# Altium schematic symbol library jlcpcb_2025_04_resistors_extended_0201.schlib: 1508 symbols (part 7 of 8) (continued)
## RTT014750FTH
designator R?  Resistance: 475Ω  (hidden comment: *)
Resistor, 475Ω, ±1%, 50mW, ±200ppm/℃, SMD 0201; Manufacturer: Uniroyal; Manufacturer Part Number: RTT014750FTH; Supplier 1: LCSC; Supplier Part Number 1: C166180; JLCPCB Part Number: C166180; Power Rating: 50mW; Category: Resistors; Package Size: 0201; JLCPCB Basic Part: Yes; Tolerance: ±1%; Temperature Coefficient: ±200ppm/℃; ComponentLink1Description: Datasheet; ComponentLink1URL: https://wmsc.lcsc.com/wmsc/upload/file/pdf/v2/lcsc/2304140030_RALEC-RTT014750FTH_C166180.pdf; ComponentLink2Description: JLCPCB Part URL; ComponentLink2URL: https://jlcpcb.com/partdetail/C166180
pins: 1, 2
1 alternate drawing of the same symbol

## RTT014752FTH
designator R?  Resistance: 47.5kΩ  (hidden comment: *)
Resistor, 47.5kΩ, ±1%, 50mW, ±200ppm/℃, SMD 0201; Manufacturer: Uniroyal; Manufacturer Part Number: RTT014752FTH; Supplier 1: LCSC; Supplier Part Number 1: C166179; JLCPCB Part Number: C166179; Power Rating: 50mW; Category: Resistors; Package Size: 0201; JLCPCB Basic Part: Yes; Tolerance: ±1%; Temperature Coefficient: ±200ppm/℃; ComponentLink1Description: Datasheet; ComponentLink1URL: https://wmsc.lcsc.com/wmsc/upload/file/pdf/v2/lcsc/2304140030_RALEC-RTT014752FTH_C166179.pdf; ComponentLink2Description: JLCPCB Part URL; ComponentLink2URL: https://jlcpcb.com/partdetail/C166179
pins: 1, 2
1 alternate drawing of the same symbol

## RTT014990FTH
designator R?  Resistance: 499Ω  (hidden comment: *)
Resistor, 499Ω, ±1%, 50mW, 25V, ±200ppm/℃, -55℃~+125℃, SMD 0201; Manufacturer: Uniroyal; Manufacturer Part Number: RTT014990FTH; Supplier 1: LCSC; Supplier Part Number 1: C166172; JLCPCB Part Number: C166172; Power Rating: 50mW; Category: Resistors; Package Size: 0201; JLCPCB Basic Part: Yes; Tolerance: ±1%; Voltage Rating: 25V; Temperature Coefficient: ±200ppm/℃; Temperature Rating: -55℃~+125℃; ComponentLink1Description: Datasheet; ComponentLink1URL: https://wmsc.lcsc.com/wmsc/upload/file/pdf/v2/lcsc/2304140030_RALEC-RTT014990FTH_C166172.pdf; ComponentLink2Description: JLCPCB Part URL; ComponentLink2URL: https://jlcpcb.com/partdetail/C166172
pins: 1, 2
1 alternate drawing of the same symbol

## RTT014993FTH
designator R?  Resistance: 499kΩ  (hidden comment: *)
Resistor, 499kΩ, ±1%, 50mW, 25V, ±200ppm/℃, -55℃~+125℃, SMD 0201; Manufacturer: Uniroyal; Manufacturer Part Number: RTT014993FTH; Supplier 1: LCSC; Supplier Part Number 1: C166171; JLCPCB Part Number: C166171; Power Rating: 50mW; Category: Resistors; Package Size: 0201; JLCPCB Basic Part: Yes; Tolerance: ±1%; Voltage Rating: 25V; Temperature Coefficient: ±200ppm/℃; Temperature Rating: -55℃~+125℃; ComponentLink1Description: Datasheet; ComponentLink1URL: https://wmsc.lcsc.com/wmsc/upload/file/pdf/v2/lcsc/2304140030_RALEC-RTT014993FTH_C166171.pdf; ComponentLink2Description: JLCPCB Part URL; ComponentLink2URL: https://jlcpcb.com/partdetail/C166171
pins: 1, 2
1 alternate drawing of the same symbol

## RTT014994FTH
designator R?  Resistance: 4.99MΩ  (hidden comment: *)
Resistor, 4.99MΩ, ±1%, 50mW, 25V, ±200ppm/℃, -55℃~+125℃, SMD 0201; Manufacturer: Uniroyal; Manufacturer Part Number: RTT014994FTH; Supplier 1: LCSC; Supplier Part Number 1: C166170; JLCPCB Part Number: C166170; Power Rating: 50mW; Category: Resistors; Package Size: 0201; JLCPCB Basic Part: Yes; Tolerance: ±1%; Voltage Rating: 25V; Temperature Coefficient: ±200ppm/℃; Temperature Rating: -55℃~+125℃; ComponentLink1Description: Datasheet; ComponentLink1URL: https://wmsc.lcsc.com/wmsc/upload/file/pdf/v2/lcsc/2304140030_RALEC-RTT014994FTH_C166170.pdf; ComponentLink2Description: JLCPCB Part URL; ComponentLink2URL: https://jlcpcb.com/partdetail/C166170
pins: 1, 2
1 alternate drawing of the same symbol

## RTT015111FTH
designator R?  Resistance: 5.11kΩ  (hidden comment: *)
Resistor, 5.11kΩ, ±1%, 50mW, ±200ppm/℃, SMD 0201; Manufacturer: Uniroyal; Manufacturer Part Number: RTT015111FTH; Supplier 1: LCSC; Supplier Part Number 1: C166168; JLCPCB Part Number: C166168; Power Rating: 50mW; Category: Resistors; Package Size: 0201; JLCPCB Basic Part: Yes; Tolerance: ±1%; Temperature Coefficient: ±200ppm/℃; ComponentLink1Description: Datasheet; ComponentLink1URL: https://wmsc.lcsc.com/wmsc/upload/file/pdf/v2/lcsc/2304140030_RALEC-RTT015111FTH_C166168.pdf; ComponentLink2Description: JLCPCB Part URL; ComponentLink2URL: https://jlcpcb.com/partdetail/C166168
pins: 1, 2
1 alternate drawing of the same symbol

## RTT015112FTH
designator R?  Resistance: 51.1kΩ  (hidden comment: *)
Resistor, 51.1kΩ, ±1%, 50mW, 25V, ±200ppm/℃, -55℃~+125℃, SMD 0201; Manufacturer: Uniroyal; Manufacturer Part Number: RTT015112FTH; Supplier 1: LCSC; Supplier Part Number 1: C166167; JLCPCB Part Number: C166167; Power Rating: 50mW; Category: Resistors; Package Size: 0201; JLCPCB Basic Part: Yes; Tolerance: ±1%; Voltage Rating: 25V; Temperature Coefficient: ±200ppm/℃; Temperature Rating: -55℃~+125℃; ComponentLink1Description: Datasheet; ComponentLink1URL: https://wmsc.lcsc.com/wmsc/upload/file/pdf/v2/lcsc/2304140030_RALEC-RTT015112FTH_C166167.pdf; ComponentLink2Description: JLCPCB Part URL; ComponentLink2URL: https://jlcpcb.com/partdetail/C166167
pins: 1, 2
1 alternate drawing of the same symbol

## RTT015113FTH
designator R?  Resistance: 511kΩ  (hidden comment: *)
Resistor, 511kΩ, ±1%, 50mW, 25V, ±200ppm/℃, -55℃~+125℃, SMD 0201; Manufacturer: Uniroyal; Manufacturer Part Number: RTT015113FTH; Supplier 1: LCSC; Supplier Part Number 1: C166166; JLCPCB Part Number: C166166; Power Rating: 50mW; Category: Resistors; Package Size: 0201; JLCPCB Basic Part: Yes; Tolerance: ±1%; Voltage Rating: 25V; Temperature Coefficient: ±200ppm/℃; Temperature Rating: -55℃~+125℃; ComponentLink1Description: Datasheet; ComponentLink1URL: https://wmsc.lcsc.com/wmsc/upload/file/pdf/v2/lcsc/2304140030_RALEC-RTT015113FTH_C166166.pdf; ComponentLink2Description: JLCPCB Part URL; ComponentLink2URL: https://jlcpcb.com/partdetail/C166166
pins: 1, 2
1 alternate drawing of the same symbol

## RTT015230FTH
designator R?  Resistance: 523Ω  (hidden comment: *)
Resistor, 523Ω, ±1%, 50mW, ±200ppm/℃, SMD 0201; Manufacturer: Uniroyal; Manufacturer Part Number: RTT015230FTH; Supplier 1: LCSC; Supplier Part Number 1: C158463; JLCPCB Part Number: C158463; Power Rating: 50mW; Category: Resistors; Package Size: 0201; JLCPCB Basic Part: Yes; Tolerance: ±1%; Temperature Coefficient: ±200ppm/℃; ComponentLink1Description: Datasheet; ComponentLink1URL: https://wmsc.lcsc.com/wmsc/upload/file/pdf/v2/lcsc/2304140030_RALEC-RTT015230FTH_C158463.pdf; ComponentLink2Description: JLCPCB Part URL; ComponentLink2URL: https://jlcpcb.com/partdetail/C158463
pins: 1, 2
1 alternate drawing of the same symbol

## RTT015360FTH
designator R?  Resistance: 536Ω  (hidden comment: *)
Resistor, 536Ω, ±1%, 50mW, 25V, ±200ppm/℃, -55℃~+125℃, SMD 0201; Manufacturer: Uniroyal; Manufacturer Part Number: RTT015360FTH; Supplier 1: LCSC; Supplier Part Number 1: C166162; JLCPCB Part Number: C166162; Power Rating: 50mW; Category: Resistors; Package Size: 0201; JLCPCB Basic Part: Yes; Tolerance: ±1%; Voltage Rating: 25V; Temperature Coefficient: ±200ppm/℃; Temperature Rating: -55℃~+125℃; ComponentLink1Description: Datasheet; ComponentLink1URL: https://wmsc.lcsc.com/wmsc/upload/file/pdf/v2/lcsc/2304140030_RALEC-RTT015360FTH_C166162.pdf; ComponentLink2Description: JLCPCB Part URL; ComponentLink2URL: https://jlcpcb.com/partdetail/C166162
pins: 1, 2
1 alternate drawing of the same symbol

## RTT015362FTH
designator R?  Resistance: 53.6kΩ  (hidden comment: *)
Resistor, 53.6kΩ, ±1%, 50mW, 25V, ±200ppm/℃, -55℃~+125℃, SMD 0201; Manufacturer: Uniroyal; Manufacturer Part Number: RTT015362FTH; Supplier 1: LCSC; Supplier Part Number 1: C166160; JLCPCB Part Number: C166160; Power Rating: 50mW; Category: Resistors; Package Size: 0201; JLCPCB Basic Part: Yes; Tolerance: ±1%; Voltage Rating: 25V; Temperature Coefficient: ±200ppm/℃; Temperature Rating: -55℃~+125℃; ComponentLink1Description: Datasheet; ComponentLink1URL: https://wmsc.lcsc.com/wmsc/upload/file/pdf/v2/lcsc/2304140030_RALEC-RTT015362FTH_C166160.pdf; ComponentLink2Description: JLCPCB Part URL; ComponentLink2URL: https://jlcpcb.com/partdetail/C166160
pins: 1, 2
1 alternate drawing of the same symbol

## RTT015490FTH
designator R?  Resistance: 549Ω  (hidden comment: *)
Resistor, 549Ω, ±1%, 50mW, 25V, ±200ppm/℃, -55℃~+125℃, SMD 0201; Manufacturer: Uniroyal; Manufacturer Part Number: RTT015490FTH; Supplier 1: LCSC; Supplier Part Number 1: C166159; JLCPCB Part Number: C166159; Power Rating: 50mW; Category: Resistors; Package Size: 0201; JLCPCB Basic Part: Yes; Tolerance: ±1%; Voltage Rating: 25V; Temperature Coefficient: ±200ppm/℃; Temperature Rating: -55℃~+125℃; ComponentLink1Description: Datasheet; ComponentLink1URL: https://wmsc.lcsc.com/wmsc/upload/file/pdf/v2/lcsc/2304140030_RALEC-RTT015490FTH_C166159.pdf; ComponentLink2Description: JLCPCB Part URL; ComponentLink2URL: https://jlcpcb.com/partdetail/C166159
pins: 1, 2
1 alternate drawing of the same symbol

## RTT015491FTH
designator R?  Resistance: 5.49kΩ  (hidden comment: *)
Resistor, 5.49kΩ, ±1%, 50mW, ±200ppm/℃, SMD 0201; Manufacturer: Uniroyal; Manufacturer Part Number: RTT015491FTH; Supplier 1: LCSC; Supplier Part Number 1: C166158; JLCPCB Part Number: C166158; Power Rating: 50mW; Category: Resistors; Package Size: 0201; JLCPCB Basic Part: Yes; Tolerance: ±1%; Temperature Coefficient: ±200ppm/℃; ComponentLink1Description: Datasheet; ComponentLink1URL: https://wmsc.lcsc.com/wmsc/upload/file/pdf/v2/lcsc/2304140030_RALEC-RTT015491FTH_C166158.pdf; ComponentLink2Description: JLCPCB Part URL; ComponentLink2URL: https://jlcpcb.com/partdetail/C166158
pins: 1, 2
1 alternate drawing of the same symbol

## RTT015492FTH
designator R?  Resistance: 54.9kΩ  (hidden comment: *)
Resistor, 54.9kΩ, ±1%, 50mW, 25V, ±200ppm/℃, -55℃~+125℃, SMD 0201; Manufacturer: Uniroyal; Manufacturer Part Number: RTT015492FTH; Supplier 1: LCSC; Supplier Part Number 1: C166157; JLCPCB Part Number: C166157; Power Rating: 50mW; Category: Resistors; Package Size: 0201; JLCPCB Basic Part: Yes; Tolerance: ±1%; Voltage Rating: 25V; Temperature Coefficient: ±200ppm/℃; Temperature Rating: -55℃~+125℃; ComponentLink1Description: Datasheet; ComponentLink1URL: https://wmsc.lcsc.com/wmsc/upload/file/pdf/v2/lcsc/2304140030_RALEC-RTT015492FTH_C166157.pdf; ComponentLink2Description: JLCPCB Part URL; ComponentLink2URL: https://jlcpcb.com/partdetail/C166157
pins: 1, 2
1 alternate drawing of the same symbol

## RTT015600FTH
designator R?  Resistance: 560Ω  (hidden comment: *)
Resistor, 560Ω, ±1%, 50mW, 25V, ±200ppm/℃, -55℃~+125℃, SMD 0201; Manufacturer: Uniroyal; Manufacturer Part Number: RTT015600FTH; Supplier 1: LCSC; Supplier Part Number 1: C158457; JLCPCB Part Number: C158457; Power Rating: 50mW; Category: Resistors; Package Size: 0201; JLCPCB Basic Part: Yes; Tolerance: ±1%; Voltage Rating: 25V; Temperature Coefficient: ±200ppm/℃; Temperature Rating: -55℃~+125℃; ComponentLink1Description: Datasheet; ComponentLink1URL: https://wmsc.lcsc.com/wmsc/upload/file/pdf/v2/lcsc/2304140030_RALEC-RTT015600FTH_C158457.pdf; ComponentLink2Description: JLCPCB Part URL; ComponentLink2URL: https://jlcpcb.com/partdetail/C158457
pins: 1, 2
1 alternate drawing of the same symbol

## RTT015602FTH
designator R?  Resistance: 56kΩ  (hidden comment: *)
Resistor, 56kΩ, ±1%, 50mW, 25V, ±200ppm/℃, -55℃~+125℃, SMD 0201; Manufacturer: Uniroyal; Manufacturer Part Number: RTT015602FTH; Supplier 1: LCSC; Supplier Part Number 1: C158452; JLCPCB Part Number: C158452; Power Rating: 50mW; Category: Resistors; Package Size: 0201; JLCPCB Basic Part: Yes; Tolerance: ±1%; Voltage Rating: 25V; Temperature Coefficient: ±200ppm/℃; Temperature Rating: -55℃~+125℃; ComponentLink1Description: Datasheet; ComponentLink1URL: https://wmsc.lcsc.com/wmsc/upload/file/pdf/v2/lcsc/2304140030_RALEC-RTT015602FTH_C158452.pdf; ComponentLink2Description: JLCPCB Part URL; ComponentLink2URL: https://jlcpcb.com/partdetail/C158452
pins: 1, 2
1 alternate drawing of the same symbol

## RTT015603FTH
designator R?  Resistance: 560kΩ  (hidden comment: *)
Resistor, 560kΩ, ±1%, 50mW, 25V, ±200ppm/℃, -55℃~+125℃, SMD 0201; Manufacturer: Uniroyal; Manufacturer Part Number: RTT015603FTH; Supplier 1: LCSC; Supplier Part Number 1: C158450; JLCPCB Part Number: C158450; Power Rating: 50mW; Category: Resistors; Package Size: 0201; JLCPCB Basic Part: Yes; Tolerance: ±1%; Voltage Rating: 25V; Temperature Coefficient: ±200ppm/℃; Temperature Rating: -55℃~+125℃; ComponentLink1Description: Datasheet; ComponentLink1URL: https://wmsc.lcsc.com/wmsc/upload/file/pdf/v2/lcsc/2304140030_RALEC-RTT015603FTH_C158450.pdf; ComponentLink2Description: JLCPCB Part URL; ComponentLink2URL: https://jlcpcb.com/partdetail/C158450
pins: 1, 2
1 alternate drawing of the same symbol

## RTT015621FTH
designator R?  Resistance: 5.62kΩ  (hidden comment: *)
Resistor, 5.62kΩ, ±1%, 50mW, ±200ppm/℃, SMD 0201; Manufacturer: Uniroyal; Manufacturer Part Number: RTT015621FTH; Supplier 1: LCSC; Supplier Part Number 1: C166152; JLCPCB Part Number: C166152; Power Rating: 50mW; Category: Resistors; Package Size: 0201; JLCPCB Basic Part: Yes; Tolerance: ±1%; Temperature Coefficient: ±200ppm/℃; ComponentLink1Description: Datasheet; ComponentLink1URL: https://wmsc.lcsc.com/wmsc/upload/file/pdf/v2/lcsc/2304140030_RALEC-RTT015621FTH_C166152.pdf; ComponentLink2Description: JLCPCB Part URL; ComponentLink2URL: https://jlcpcb.com/partdetail/C166152
pins: 1, 2
1 alternate drawing of the same symbol

## RTT015622FTH
designator R?  Resistance: 56.2kΩ  (hidden comment: *)
Resistor, 56.2kΩ, ±1%, 50mW, 25V, ±200ppm/℃, -55℃~+125℃, SMD 0201; Manufacturer: Uniroyal; Manufacturer Part Number: RTT015622FTH; Supplier 1: LCSC; Supplier Part Number 1: C166151; JLCPCB Part Number: C166151; Power Rating: 50mW; Category: Resistors; Package Size: 0201; JLCPCB Basic Part: Yes; Tolerance: ±1%; Voltage Rating: 25V; Temperature Coefficient: ±200ppm/℃; Temperature Rating: -55℃~+125℃; ComponentLink1Description: Datasheet; ComponentLink1URL: https://wmsc.lcsc.com/wmsc/upload/file/pdf/v2/lcsc/2304140030_RALEC-RTT015622FTH_C166151.pdf; ComponentLink2Description: JLCPCB Part URL; ComponentLink2URL: https://jlcpcb.com/partdetail/C166151
pins: 1, 2
1 alternate drawing of the same symbol

## RTT015623FTH
designator R?  Resistance: 562kΩ  (hidden comment: *)
Resistor, 562kΩ, ±1%, 50mW, 25V, ±200ppm/℃, -55℃~+125℃, SMD 0201; Manufacturer: Uniroyal; Manufacturer Part Number: RTT015623FTH; Supplier 1: LCSC; Supplier Part Number 1: C166150; JLCPCB Part Number: C166150; Power Rating: 50mW; Category: Resistors; Package Size: 0201; JLCPCB Basic Part: Yes; Tolerance: ±1%; Voltage Rating: 25V; Temperature Coefficient: ±200ppm/℃; Temperature Rating: -55℃~+125℃; ComponentLink1Description: Datasheet; ComponentLink1URL: https://wmsc.lcsc.com/wmsc/upload/file/pdf/v2/lcsc/2304140030_RALEC-RTT015623FTH_C166150.pdf; ComponentLink2Description: JLCPCB Part URL; ComponentLink2URL: https://jlcpcb.com/partdetail/C166150
pins: 1, 2
1 alternate drawing of the same symbol

## RTT015761FTH
designator R?  Resistance: 5.76kΩ  (hidden comment: *)
Resistor, 5.76kΩ, ±1%, 50mW, 25V, ±200ppm/℃, -55℃~+125℃, SMD 0201; Manufacturer: Uniroyal; Manufacturer Part Number: RTT015761FTH; Supplier 1: LCSC; Supplier Part Number 1: C166147; JLCPCB Part Number: C166147; Power Rating: 50mW; Category: Resistors; Package Size: 0201; JLCPCB Basic Part: Yes; Tolerance: ±1%; Voltage Rating: 25V; Temperature Coefficient: ±200ppm/℃; Temperature Rating: -55℃~+125℃; ComponentLink1Description: Datasheet; ComponentLink1URL: https://wmsc.lcsc.com/wmsc/upload/file/pdf/v2/lcsc/2304140030_RALEC-RTT015761FTH_C166147.pdf; ComponentLink2Description: JLCPCB Part URL; ComponentLink2URL: https://jlcpcb.com/partdetail/C166147
pins: 1, 2
1 alternate drawing of the same symbol

## RTT015903FTH
designator R?  Resistance: 590kΩ  (hidden comment: *)
Resistor, 590kΩ, ±1%, 50mW, ±200ppm/℃, SMD 0201; Manufacturer: Uniroyal; Manufacturer Part Number: RTT015903FTH; Supplier 1: LCSC; Supplier Part Number 1: C166142; JLCPCB Part Number: C166142; Power Rating: 50mW; Category: Resistors; Package Size: 0201; JLCPCB Basic Part: Yes; Tolerance: ±1%; Temperature Coefficient: ±200ppm/℃; ComponentLink1Description: Datasheet; ComponentLink1URL: https://wmsc.lcsc.com/wmsc/upload/file/pdf/v2/lcsc/2304140030_RALEC-RTT015903FTH_C166142.pdf; ComponentLink2Description: JLCPCB Part URL; ComponentLink2URL: https://jlcpcb.com/partdetail/C166142
pins: 1, 2
1 alternate drawing of the same symbol

## RTT016040FTH
designator R?  Resistance: 604Ω  (hidden comment: *)
Resistor, 604Ω, ±1%, 50mW, 25V, ±200ppm/℃, -55℃~+125℃, SMD 0201; Manufacturer: Uniroyal; Manufacturer Part Number: RTT016040FTH; Supplier 1: LCSC; Supplier Part Number 1: C158430; JLCPCB Part Number: C158430; Power Rating: 50mW; Category: Resistors; Package Size: 0201; JLCPCB Basic Part: Yes; Tolerance: ±1%; Voltage Rating: 25V; Temperature Coefficient: ±200ppm/℃; Temperature Rating: -55℃~+125℃; ComponentLink1Description: Datasheet; ComponentLink1URL: https://wmsc.lcsc.com/wmsc/upload/file/pdf/v2/lcsc/2304140030_RALEC-RTT016040FTH_C158430.pdf; ComponentLink2Description: JLCPCB Part URL; ComponentLink2URL: https://jlcpcb.com/partdetail/C158430
pins: 1, 2
1 alternate drawing of the same symbol

## RTT016042FTH
designator R?  Resistance: 60.4kΩ  (hidden comment: *)
Resistor, 60.4kΩ, ±1%, 50mW, 25V, ±200ppm/℃, -55℃~+125℃, SMD 0201; Manufacturer: Uniroyal; Manufacturer Part Number: RTT016042FTH; Supplier 1: LCSC; Supplier Part Number 1: C158426; JLCPCB Part Number: C158426; Power Rating: 50mW; Category: Resistors; Package Size: 0201; JLCPCB Basic Part: Yes; Tolerance: ±1%; Voltage Rating: 25V; Temperature Coefficient: ±200ppm/℃; Temperature Rating: -55℃~+125℃; ComponentLink1Description: Datasheet; ComponentLink1URL: https://wmsc.lcsc.com/wmsc/upload/file/pdf/v2/lcsc/2304140030_RALEC-RTT016042FTH_C158426.pdf; ComponentLink2Description: JLCPCB Part URL; ComponentLink2URL: https://jlcpcb.com/partdetail/C158426
pins: 1, 2
1 alternate drawing of the same symbol

## RTT016192FTH
designator R?  Resistance: 61.9kΩ  (hidden comment: *)
Resistor, 61.9kΩ, ±1%, 50mW, 25V, ±200ppm/℃, -55℃~+125℃, SMD 0201; Manufacturer: Uniroyal; Manufacturer Part Number: RTT016192FTH; Supplier 1: LCSC; Supplier Part Number 1: C158420; JLCPCB Part Number: C158420; Power Rating: 50mW; Category: Resistors; Package Size: 0201; JLCPCB Basic Part: Yes; Tolerance: ±1%; Voltage Rating: 25V; Temperature Coefficient: ±200ppm/℃; Temperature Rating: -55℃~+125℃; ComponentLink1Description: Datasheet; ComponentLink1URL: https://wmsc.lcsc.com/wmsc/upload/file/pdf/v2/lcsc/2304140030_RALEC-RTT016192FTH_C158420.pdf; ComponentLink2Description: JLCPCB Part URL; ComponentLink2URL: https://jlcpcb.com/partdetail/C158420
pins: 1, 2
1 alternate drawing of the same symbol

## RTT016193FTH
designator R?  Resistance: 619kΩ  (hidden comment: *)
Resistor, 619kΩ, ±1%, 50mW, 25V, ±200ppm/℃, -55℃~+125℃, SMD 0201; Manufacturer: Uniroyal; Manufacturer Part Number: RTT016193FTH; Supplier 1: LCSC; Supplier Part Number 1: C166138; JLCPCB Part Number: C166138; Power Rating: 50mW; Category: Resistors; Package Size: 0201; JLCPCB Basic Part: Yes; Tolerance: ±1%; Voltage Rating: 25V; Temperature Coefficient: ±200ppm/℃; Temperature Rating: -55℃~+125℃; ComponentLink1Description: Datasheet; ComponentLink1URL: https://wmsc.lcsc.com/wmsc/upload/file/pdf/v2/lcsc/2304140030_RALEC-RTT016193FTH_C166138.pdf; ComponentLink2Description: JLCPCB Part URL; ComponentLink2URL: https://jlcpcb.com/partdetail/C166138
pins: 1, 2
1 alternate drawing of the same symbol

## RTT016341FTH
designator R?  Resistance: 6.34kΩ  (hidden comment: *)
Resistor, 6.34kΩ, ±1%, 50mW, 25V, ±200ppm/℃, -55℃~+125℃, SMD 0201; Manufacturer: Uniroyal; Manufacturer Part Number: RTT016341FTH; Supplier 1: LCSC; Supplier Part Number 1: C158401; JLCPCB Part Number: C158401; Power Rating: 50mW; Category: Resistors; Package Size: 0201; JLCPCB Basic Part: Yes; Tolerance: ±1%; Voltage Rating: 25V; Temperature Coefficient: ±200ppm/℃; Temperature Rating: -55℃~+125℃; ComponentLink1Description: Datasheet; ComponentLink1URL: https://wmsc.lcsc.com/wmsc/upload/file/pdf/v2/lcsc/2304140030_RALEC-RTT016341FTH_C158401.pdf; ComponentLink2Description: JLCPCB Part URL; ComponentLink2URL: https://jlcpcb.com/partdetail/C158401
pins: 1, 2
1 alternate drawing of the same symbol

## RTT016342FTH
designator R?  Resistance: 63.4kΩ  (hidden comment: *)
Resistor, 63.4kΩ, ±1%, 50mW, 25V, ±200ppm/℃, -55℃~+125℃, SMD 0201; Manufacturer: Uniroyal; Manufacturer Part Number: RTT016342FTH; Supplier 1: LCSC; Supplier Part Number 1: C166136; JLCPCB Part Number: C166136; Power Rating: 50mW; Category: Resistors; Package Size: 0201; JLCPCB Basic Part: Yes; Tolerance: ±1%; Voltage Rating: 25V; Temperature Coefficient: ±200ppm/℃; Temperature Rating: -55℃~+125℃; ComponentLink1Description: Datasheet; ComponentLink1URL: https://wmsc.lcsc.com/wmsc/upload/file/pdf/v2/lcsc/2304140030_RALEC-RTT016342FTH_C166136.pdf; ComponentLink2Description: JLCPCB Part URL; ComponentLink2URL: https://jlcpcb.com/partdetail/C166136
pins: 1, 2
1 alternate drawing of the same symbol

## RTT016343FTH
designator R?  Resistance: 634kΩ  (hidden comment: *)
Resistor, 634kΩ, ±1%, 50mW, 25V, ±200ppm/℃, -55℃~+125℃, SMD 0201; Manufacturer: Uniroyal; Manufacturer Part Number: RTT016343FTH; Supplier 1: LCSC; Supplier Part Number 1: C166135; JLCPCB Part Number: C166135; Power Rating: 50mW; Category: Resistors; Package Size: 0201; JLCPCB Basic Part: Yes; Tolerance: ±1%; Voltage Rating: 25V; Temperature Coefficient: ±200ppm/℃; Temperature Rating: -55℃~+125℃; ComponentLink1Description: Datasheet; ComponentLink1URL: https://wmsc.lcsc.com/wmsc/upload/file/pdf/v2/lcsc/2304140030_RALEC-RTT016343FTH_C166135.pdf; ComponentLink2Description: JLCPCB Part URL; ComponentLink2URL: https://jlcpcb.com/partdetail/C166135
pins: 1, 2
1 alternate drawing of the same symbol

## RTT016490FTH
designator R?  Resistance: 649Ω  (hidden comment: *)
Resistor, 649Ω, ±1%, 50mW, 25V, ±200ppm/℃, -55℃~+125℃, SMD 0201; Manufacturer: Uniroyal; Manufacturer Part Number: RTT016490FTH; Supplier 1: LCSC; Supplier Part Number 1: C166133; JLCPCB Part Number: C166133; Power Rating: 50mW; Category: Resistors; Package Size: 0201; JLCPCB Basic Part: Yes; Tolerance: ±1%; Voltage Rating: 25V; Temperature Coefficient: ±200ppm/℃; Temperature Rating: -55℃~+125℃; ComponentLink1Description: Datasheet; ComponentLink1URL: https://wmsc.lcsc.com/wmsc/upload/file/pdf/v2/lcsc/2304140030_RALEC-RTT016490FTH_C166133.pdf; ComponentLink2Description: JLCPCB Part URL; ComponentLink2URL: https://jlcpcb.com/partdetail/C166133
pins: 1, 2
1 alternate drawing of the same symbol

## RTT016491FTH
designator R?  Resistance: 6.49kΩ  (hidden comment: *)
Resistor, 6.49kΩ, ±1%, 50mW, ±200ppm/℃, SMD 0201; Manufacturer: Uniroyal; Manufacturer Part Number: RTT016491FTH; Supplier 1: LCSC; Supplier Part Number 1: C166132; JLCPCB Part Number: C166132; Power Rating: 50mW; Category: Resistors; Package Size: 0201; JLCPCB Basic Part: Yes; Tolerance: ±1%; Temperature Coefficient: ±200ppm/℃; ComponentLink1Description: Datasheet; ComponentLink1URL: https://wmsc.lcsc.com/wmsc/upload/file/pdf/v2/lcsc/2304140030_RALEC-RTT016491FTH_C166132.pdf; ComponentLink2Description: JLCPCB Part URL; ComponentLink2URL: https://jlcpcb.com/partdetail/C166132
pins: 1, 2
1 alternate drawing of the same symbol

## RTT016652FTH
designator R?  Resistance: 66.5kΩ  (hidden comment: *)
Resistor, 66.5kΩ, ±1%, 50mW, ±200ppm/℃, SMD 0201; Manufacturer: Uniroyal; Manufacturer Part Number: RTT016652FTH; Supplier 1: LCSC; Supplier Part Number 1: C158395; JLCPCB Part Number: C158395; Power Rating: 50mW; Category: Resistors; Package Size: 0201; JLCPCB Basic Part: Yes; Tolerance: ±1%; Temperature Coefficient: ±200ppm/℃; ComponentLink1Description: Datasheet; ComponentLink1URL: https://wmsc.lcsc.com/wmsc/upload/file/pdf/v2/lcsc/2304140030_RALEC-RTT016652FTH_C158395.pdf; ComponentLink2Description: JLCPCB Part URL; ComponentLink2URL: https://jlcpcb.com/partdetail/C158395
pins: 1, 2
1 alternate drawing of the same symbol

## RTT016653FTH
designator R?  Resistance: 665kΩ  (hidden comment: *)
Resistor, 665kΩ, ±1%, 50mW, 25V, ±200ppm/℃, -55℃~+125℃, SMD 0201; Manufacturer: Uniroyal; Manufacturer Part Number: RTT016653FTH; Supplier 1: LCSC; Supplier Part Number 1: C166128; JLCPCB Part Number: C166128; Power Rating: 50mW; Category: Resistors; Package Size: 0201; JLCPCB Basic Part: Yes; Tolerance: ±1%; Voltage Rating: 25V; Temperature Coefficient: ±200ppm/℃; Temperature Rating: -55℃~+125℃; ComponentLink1Description: Datasheet; ComponentLink1URL: https://wmsc.lcsc.com/wmsc/upload/file/pdf/v2/lcsc/2304140030_RALEC-RTT016653FTH_C166128.pdf; ComponentLink2Description: JLCPCB Part URL; ComponentLink2URL: https://jlcpcb.com/partdetail/C166128
pins: 1, 2
1 alternate drawing of the same symbol

## RTT016801FTH
designator R?  Resistance: 6.8kΩ  (hidden comment: *)
Resistor, 6.8kΩ, ±1%, 50mW, ±200ppm/℃, SMD 0201; Manufacturer: Uniroyal; Manufacturer Part Number: RTT016801FTH; Supplier 1: LCSC; Supplier Part Number 1: C158388; JLCPCB Part Number: C158388; Power Rating: 50mW; Category: Resistors; Package Size: 0201; JLCPCB Basic Part: Yes; Tolerance: ±1%; Temperature Coefficient: ±200ppm/℃; ComponentLink1Description: Datasheet; ComponentLink1URL: https://wmsc.lcsc.com/wmsc/upload/file/pdf/v2/lcsc/2304140030_RALEC-RTT016801FTH_C158388.pdf; ComponentLink2Description: JLCPCB Part URL; ComponentLink2URL: https://jlcpcb.com/partdetail/C158388
pins: 1, 2
1 alternate drawing of the same symbol

## RTT016802FTH
designator R?  Resistance: 68kΩ  (hidden comment: *)
Resistor, 68kΩ, ±1%, 50mW, 25V, ±200ppm/℃, -55℃~+125℃, SMD 0201; Manufacturer: Uniroyal; Manufacturer Part Number: RTT016802FTH; Supplier 1: LCSC; Supplier Part Number 1: C166127; JLCPCB Part Number: C166127; Power Rating: 50mW; Category: Resistors; Package Size: 0201; JLCPCB Basic Part: Yes; Tolerance: ±1%; Voltage Rating: 25V; Temperature Coefficient: ±200ppm/℃; Temperature Rating: -55℃~+125℃; ComponentLink1Description: Datasheet; ComponentLink1URL: https://wmsc.lcsc.com/wmsc/upload/file/pdf/v2/lcsc/2304140030_RALEC-RTT016802FTH_C166127.pdf; ComponentLink2Description: JLCPCB Part URL; ComponentLink2URL: https://jlcpcb.com/partdetail/C166127
pins: 1, 2
1 alternate drawing of the same symbol

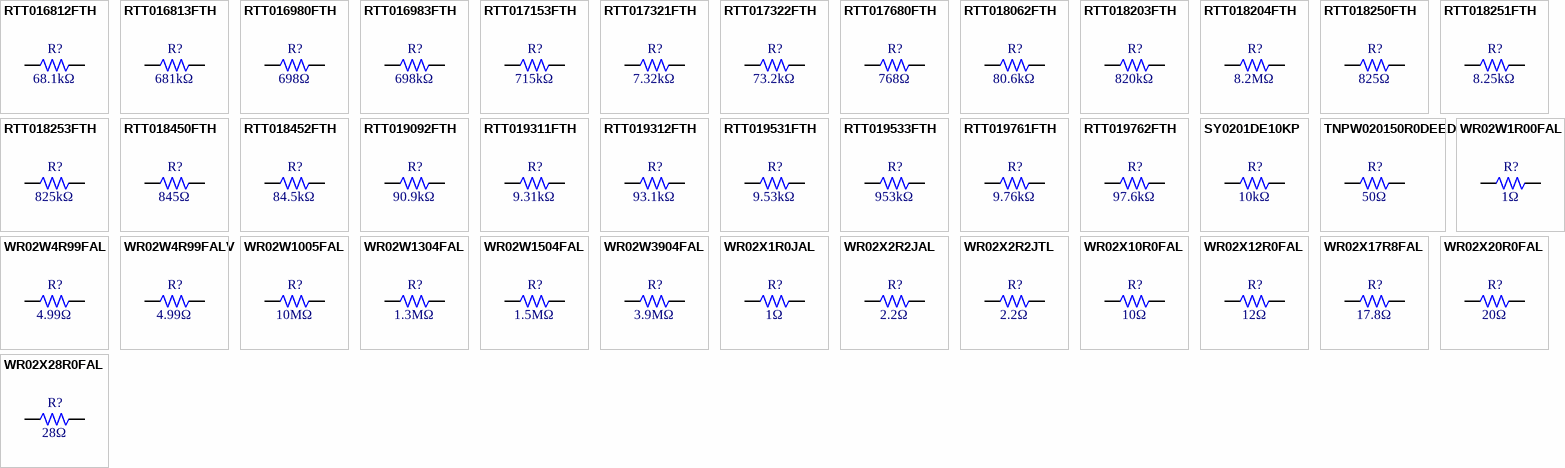
[diagram p34: symbols RTT016812FTH to WR02X28R0FAL]

## RTT016812FTH
designator R?  Resistance: 68.1kΩ  (hidden comment: *)
Resistor, 68.1kΩ, ±1%, 50mW, 25V, ±200ppm/℃, -55℃~+125℃, SMD 0201; Manufacturer: Uniroyal; Manufacturer Part Number: RTT016812FTH; Supplier 1: LCSC; Supplier Part Number 1: C166124; JLCPCB Part Number: C166124; Power Rating: 50mW; Category: Resistors; Package Size: 0201; JLCPCB Basic Part: Yes; Tolerance: ±1%; Voltage Rating: 25V; Temperature Coefficient: ±200ppm/℃; Temperature Rating: -55℃~+125℃; ComponentLink1Description: Datasheet; ComponentLink1URL: https://wmsc.lcsc.com/wmsc/upload/file/pdf/v2/lcsc/2304140030_RALEC-RTT016812FTH_C166124.pdf; ComponentLink2Description: JLCPCB Part URL; ComponentLink2URL: https://jlcpcb.com/partdetail/C166124
pins: 1, 2
1 alternate drawing of the same symbol

## RTT016813FTH
designator R?  Resistance: 681kΩ  (hidden comment: *)
Resistor, 681kΩ, ±1%, 50mW, 25V, ±200ppm/℃, -55℃~+125℃, SMD 0201; Manufacturer: Uniroyal; Manufacturer Part Number: RTT016813FTH; Supplier 1: LCSC; Supplier Part Number 1: C158382; JLCPCB Part Number: C158382; Power Rating: 50mW; Category: Resistors; Package Size: 0201; JLCPCB Basic Part: Yes; Tolerance: ±1%; Voltage Rating: 25V; Temperature Coefficient: ±200ppm/℃; Temperature Rating: -55℃~+125℃; ComponentLink1Description: Datasheet; ComponentLink1URL: https://wmsc.lcsc.com/wmsc/upload/file/pdf/v2/lcsc/2304140030_RALEC-RTT016813FTH_C158382.pdf; ComponentLink2Description: JLCPCB Part URL; ComponentLink2URL: https://jlcpcb.com/partdetail/C158382
pins: 1, 2
1 alternate drawing of the same symbol

## RTT016980FTH
designator R?  Resistance: 698Ω  (hidden comment: *)
Resistor, 698Ω, ±1%, 50mW, 25V, ±200ppm/℃, -55℃~+125℃, SMD 0201; Manufacturer: Uniroyal; Manufacturer Part Number: RTT016980FTH; Supplier 1: LCSC; Supplier Part Number 1: C166122; JLCPCB Part Number: C166122; Power Rating: 50mW; Category: Resistors; Package Size: 0201; JLCPCB Basic Part: Yes; Tolerance: ±1%; Voltage Rating: 25V; Temperature Coefficient: ±200ppm/℃; Temperature Rating: -55℃~+125℃; ComponentLink1Description: Datasheet; ComponentLink1URL: https://wmsc.lcsc.com/wmsc/upload/file/pdf/v2/lcsc/2304140030_RALEC-RTT016980FTH_C166122.pdf; ComponentLink2Description: JLCPCB Part URL; ComponentLink2URL: https://jlcpcb.com/partdetail/C166122
pins: 1, 2
1 alternate drawing of the same symbol

## RTT016983FTH
designator R?  Resistance: 698kΩ  (hidden comment: *)
Resistor, 698kΩ, ±1%, 50mW, 25V, ±200ppm/℃, -55℃~+125℃, SMD 0201; Manufacturer: Uniroyal; Manufacturer Part Number: RTT016983FTH; Supplier 1: LCSC; Supplier Part Number 1: C158368; JLCPCB Part Number: C158368; Power Rating: 50mW; Category: Resistors; Package Size: 0201; JLCPCB Basic Part: Yes; Tolerance: ±1%; Voltage Rating: 25V; Temperature Coefficient: ±200ppm/℃; Temperature Rating: -55℃~+125℃; ComponentLink1Description: Datasheet; ComponentLink1URL: https://wmsc.lcsc.com/wmsc/upload/file/pdf/v2/lcsc/2304140030_RALEC-RTT016983FTH_C158368.pdf; ComponentLink2Description: JLCPCB Part URL; ComponentLink2URL: https://jlcpcb.com/partdetail/C158368
pins: 1, 2
1 alternate drawing of the same symbol

## RTT017153FTH
designator R?  Resistance: 715kΩ  (hidden comment: *)
Resistor, 715kΩ, ±1%, 50mW, 25V, ±200ppm/℃, -55℃~+125℃, SMD 0201; Manufacturer: Uniroyal; Manufacturer Part Number: RTT017153FTH; Supplier 1: LCSC; Supplier Part Number 1: C166117; JLCPCB Part Number: C166117; Power Rating: 50mW; Category: Resistors; Package Size: 0201; JLCPCB Basic Part: Yes; Tolerance: ±1%; Voltage Rating: 25V; Temperature Coefficient: ±200ppm/℃; Temperature Rating: -55℃~+125℃; ComponentLink1Description: Datasheet; ComponentLink1URL: https://wmsc.lcsc.com/wmsc/upload/file/pdf/v2/lcsc/2304140030_RALEC-RTT017153FTH_C166117.pdf; ComponentLink2Description: JLCPCB Part URL; ComponentLink2URL: https://jlcpcb.com/partdetail/C166117
pins: 1, 2
1 alternate drawing of the same symbol

## RTT017321FTH
designator R?  Resistance: 7.32kΩ  (hidden comment: *)
Resistor, 7.32kΩ, ±1%, 50mW, 25V, ±200ppm/℃, -55℃~+125℃, SMD 0201; Manufacturer: Uniroyal; Manufacturer Part Number: RTT017321FTH; Supplier 1: LCSC; Supplier Part Number 1: C166115; JLCPCB Part Number: C166115; Power Rating: 50mW; Category: Resistors; Package Size: 0201; JLCPCB Basic Part: Yes; Tolerance: ±1%; Voltage Rating: 25V; Temperature Coefficient: ±200ppm/℃; Temperature Rating: -55℃~+125℃; ComponentLink1Description: Datasheet; ComponentLink1URL: https://wmsc.lcsc.com/wmsc/upload/file/pdf/v2/lcsc/2304140030_RALEC-RTT017321FTH_C166115.pdf; ComponentLink2Description: JLCPCB Part URL; ComponentLink2URL: https://jlcpcb.com/partdetail/C166115
pins: 1, 2
1 alternate drawing of the same symbol

## RTT017322FTH
designator R?  Resistance: 73.2kΩ  (hidden comment: *)
Resistor, 73.2kΩ, ±1%, 50mW, 25V, ±200ppm/℃, -55℃~+125℃, SMD 0201; Manufacturer: Uniroyal; Manufacturer Part Number: RTT017322FTH; Supplier 1: LCSC; Supplier Part Number 1: C166114; JLCPCB Part Number: C166114; Power Rating: 50mW; Category: Resistors; Package Size: 0201; JLCPCB Basic Part: Yes; Tolerance: ±1%; Voltage Rating: 25V; Temperature Coefficient: ±200ppm/℃; Temperature Rating: -55℃~+125℃; ComponentLink1Description: Datasheet; ComponentLink1URL: https://wmsc.lcsc.com/wmsc/upload/file/pdf/v2/lcsc/2304140030_RALEC-RTT017322FTH_C166114.pdf; ComponentLink2Description: JLCPCB Part URL; ComponentLink2URL: https://jlcpcb.com/partdetail/C166114
pins: 1, 2
1 alternate drawing of the same symbol

## RTT017680FTH
designator R?  Resistance: 768Ω  (hidden comment: *)
Resistor, 768Ω, ±1%, 50mW, 25V, ±200ppm/℃, -55℃~+125℃, SMD 0201; Manufacturer: Uniroyal; Manufacturer Part Number: RTT017680FTH; Supplier 1: LCSC; Supplier Part Number 1: C166113; JLCPCB Part Number: C166113; Power Rating: 50mW; Category: Resistors; Package Size: 0201; JLCPCB Basic Part: Yes; Tolerance: ±1%; Voltage Rating: 25V; Temperature Coefficient: ±200ppm/℃; Temperature Rating: -55℃~+125℃; ComponentLink1Description: Datasheet; ComponentLink1URL: https://wmsc.lcsc.com/wmsc/upload/file/pdf/v2/lcsc/2304140030_RALEC-RTT017680FTH_C166113.pdf; ComponentLink2Description: JLCPCB Part URL; ComponentLink2URL: https://jlcpcb.com/partdetail/C166113
pins: 1, 2
1 alternate drawing of the same symbol

## RTT018062FTH
designator R?  Resistance: 80.6kΩ  (hidden comment: *)
Resistor, 80.6kΩ, ±1%, 50mW, 25V, ±200ppm/℃, -55℃~+125℃, SMD 0201; Manufacturer: Uniroyal; Manufacturer Part Number: RTT018062FTH; Supplier 1: LCSC; Supplier Part Number 1: C158340; JLCPCB Part Number: C158340; Power Rating: 50mW; Category: Resistors; Package Size: 0201; JLCPCB Basic Part: Yes; Tolerance: ±1%; Voltage Rating: 25V; Temperature Coefficient: ±200ppm/℃; Temperature Rating: -55℃~+125℃; ComponentLink1Description: Datasheet; ComponentLink1URL: https://wmsc.lcsc.com/wmsc/upload/file/pdf/v2/lcsc/2304140030_RALEC-RTT018062FTH_C158340.pdf; ComponentLink2Description: JLCPCB Part URL; ComponentLink2URL: https://jlcpcb.com/partdetail/C158340
pins: 1, 2
1 alternate drawing of the same symbol

## RTT018203FTH
designator R?  Resistance: 820kΩ  (hidden comment: *)
Resistor, 820kΩ, ±1%, 50mW, 25V, ±200ppm/℃, -55℃~+125℃, SMD 0201; Manufacturer: Uniroyal; Manufacturer Part Number: RTT018203FTH; Supplier 1: LCSC; Supplier Part Number 1: C158331; JLCPCB Part Number: C158331; Power Rating: 50mW; Category: Resistors; Package Size: 0201; JLCPCB Basic Part: Yes; Tolerance: ±1%; Voltage Rating: 25V; Temperature Coefficient: ±200ppm/℃; Temperature Rating: -55℃~+125℃; ComponentLink1Description: Datasheet; ComponentLink1URL: https://wmsc.lcsc.com/wmsc/upload/file/pdf/v2/lcsc/2304140030_RALEC-RTT018203FTH_C158331.pdf; ComponentLink2Description: JLCPCB Part URL; ComponentLink2URL: https://jlcpcb.com/partdetail/C158331
pins: 1, 2
1 alternate drawing of the same symbol

## RTT018204FTH
designator R?  Resistance: 8.2MΩ  (hidden comment: *)
Resistor, 8.2MΩ, ±1%, 50mW, ±200ppm/℃, SMD 0201; Manufacturer: Uniroyal; Manufacturer Part Number: RTT018204FTH; Supplier 1: LCSC; Supplier Part Number 1: C166104; JLCPCB Part Number: C166104; Power Rating: 50mW; Category: Resistors; Package Size: 0201; JLCPCB Basic Part: Yes; Tolerance: ±1%; Temperature Coefficient: ±200ppm/℃; ComponentLink1Description: Datasheet; ComponentLink1URL: https://wmsc.lcsc.com/wmsc/upload/file/pdf/v2/lcsc/2304140030_RALEC-RTT018204FTH_C166104.pdf; ComponentLink2Description: JLCPCB Part URL; ComponentLink2URL: https://jlcpcb.com/partdetail/C166104
pins: 1, 2
1 alternate drawing of the same symbol

## RTT018250FTH
designator R?  Resistance: 825Ω  (hidden comment: *)
Resistor, 825Ω, ±1%, 50mW, 25V, ±200ppm/℃, -55℃~+125℃, SMD 0201; Manufacturer: Uniroyal; Manufacturer Part Number: RTT018250FTH; Supplier 1: LCSC; Supplier Part Number 1: C166103; JLCPCB Part Number: C166103; Power Rating: 50mW; Category: Resistors; Package Size: 0201; JLCPCB Basic Part: Yes; Tolerance: ±1%; Voltage Rating: 25V; Temperature Coefficient: ±200ppm/℃; Temperature Rating: -55℃~+125℃; ComponentLink1Description: Datasheet; ComponentLink1URL: https://wmsc.lcsc.com/wmsc/upload/file/pdf/v2/lcsc/2304140030_RALEC-RTT018250FTH_C166103.pdf; ComponentLink2Description: JLCPCB Part URL; ComponentLink2URL: https://jlcpcb.com/partdetail/C166103
pins: 1, 2
1 alternate drawing of the same symbol

## RTT018251FTH
designator R?  Resistance: 8.25kΩ  (hidden comment: *)
Resistor, 8.25kΩ, ±1%, 50mW, 25V, ±200ppm/℃, -55℃~+125℃, SMD 0201; Manufacturer: Uniroyal; Manufacturer Part Number: RTT018251FTH; Supplier 1: LCSC; Supplier Part Number 1: C166102; JLCPCB Part Number: C166102; Power Rating: 50mW; Category: Resistors; Package Size: 0201; JLCPCB Basic Part: Yes; Tolerance: ±1%; Voltage Rating: 25V; Temperature Coefficient: ±200ppm/℃; Temperature Rating: -55℃~+125℃; ComponentLink1Description: Datasheet; ComponentLink1URL: https://wmsc.lcsc.com/wmsc/upload/file/pdf/v2/lcsc/2304140030_RALEC-RTT018251FTH_C166102.pdf; ComponentLink2Description: JLCPCB Part URL; ComponentLink2URL: https://jlcpcb.com/partdetail/C166102
pins: 1, 2
1 alternate drawing of the same symbol

## RTT018253FTH
designator R?  Resistance: 825kΩ  (hidden comment: *)
Resistor, 825kΩ, ±1%, 50mW, 25V, ±200ppm/℃, -55℃~+125℃, SMD 0201; Manufacturer: Uniroyal; Manufacturer Part Number: RTT018253FTH; Supplier 1: LCSC; Supplier Part Number 1: C166100; JLCPCB Part Number: C166100; Power Rating: 50mW; Category: Resistors; Package Size: 0201; JLCPCB Basic Part: Yes; Tolerance: ±1%; Voltage Rating: 25V; Temperature Coefficient: ±200ppm/℃; Temperature Rating: -55℃~+125℃; ComponentLink1Description: Datasheet; ComponentLink1URL: https://wmsc.lcsc.com/wmsc/upload/file/pdf/v2/lcsc/2304140030_RALEC-RTT018253FTH_C166100.pdf; ComponentLink2Description: JLCPCB Part URL; ComponentLink2URL: https://jlcpcb.com/partdetail/C166100
pins: 1, 2
1 alternate drawing of the same symbol

## RTT018450FTH
designator R?  Resistance: 845Ω  (hidden comment: *)
Resistor, 845Ω, ±1%, 50mW, 25V, ±200ppm/℃, -55℃~+125℃, SMD 0201; Manufacturer: Uniroyal; Manufacturer Part Number: RTT018450FTH; Supplier 1: LCSC; Supplier Part Number 1: C166098; JLCPCB Part Number: C166098; Power Rating: 50mW; Category: Resistors; Package Size: 0201; JLCPCB Basic Part: Yes; Tolerance: ±1%; Voltage Rating: 25V; Temperature Coefficient: ±200ppm/℃; Temperature Rating: -55℃~+125℃; ComponentLink1Description: Datasheet; ComponentLink1URL: https://wmsc.lcsc.com/wmsc/upload/file/pdf/v2/lcsc/2304140030_RALEC-RTT018450FTH_C166098.pdf; ComponentLink2Description: JLCPCB Part URL; ComponentLink2URL: https://jlcpcb.com/partdetail/C166098
pins: 1, 2
1 alternate drawing of the same symbol

## RTT018452FTH
designator R?  Resistance: 84.5kΩ  (hidden comment: *)
Resistor, 84.5kΩ, ±1%, 50mW, 25V, ±200ppm/℃, -55℃~+125℃, SMD 0201; Manufacturer: Uniroyal; Manufacturer Part Number: RTT018452FTH; Supplier 1: LCSC; Supplier Part Number 1: C166096; JLCPCB Part Number: C166096; Power Rating: 50mW; Category: Resistors; Package Size: 0201; JLCPCB Basic Part: Yes; Tolerance: ±1%; Voltage Rating: 25V; Temperature Coefficient: ±200ppm/℃; Temperature Rating: -55℃~+125℃; ComponentLink1Description: Datasheet; ComponentLink1URL: https://wmsc.lcsc.com/wmsc/upload/file/pdf/v2/lcsc/2304140030_RALEC-RTT018452FTH_C166096.pdf; ComponentLink2Description: JLCPCB Part URL; ComponentLink2URL: https://jlcpcb.com/partdetail/C166096
pins: 1, 2
1 alternate drawing of the same symbol

## RTT019092FTH
designator R?  Resistance: 90.9kΩ  (hidden comment: *)
Resistor, 90.9kΩ, ±1%, 50mW, 25V, ±200ppm/℃, -55℃~+125℃, SMD 0201; Manufacturer: Uniroyal; Manufacturer Part Number: RTT019092FTH; Supplier 1: LCSC; Supplier Part Number 1: C166088; JLCPCB Part Number: C166088; Power Rating: 50mW; Category: Resistors; Package Size: 0201; JLCPCB Basic Part: Yes; Tolerance: ±1%; Voltage Rating: 25V; Temperature Coefficient: ±200ppm/℃; Temperature Rating: -55℃~+125℃; ComponentLink1Description: Datasheet; ComponentLink1URL: https://wmsc.lcsc.com/wmsc/upload/file/pdf/v2/lcsc/2304140030_RALEC-RTT019092FTH_C166088.pdf; ComponentLink2Description: JLCPCB Part URL; ComponentLink2URL: https://jlcpcb.com/partdetail/C166088
pins: 1, 2
1 alternate drawing of the same symbol